# Altium footprint library kalios.PcbLib: 404 footprints (part 9 of 26)
Each footprint in its own frame and in the unit in brackets; x right, y up, seen from the top. Pads: shape width x height; smd on the part's side, far side on the other; paste and mask are expansions set on the pad; w line width, h text height; cw(c..) or ccw(c..) is an arc to the next point about the centre after c.
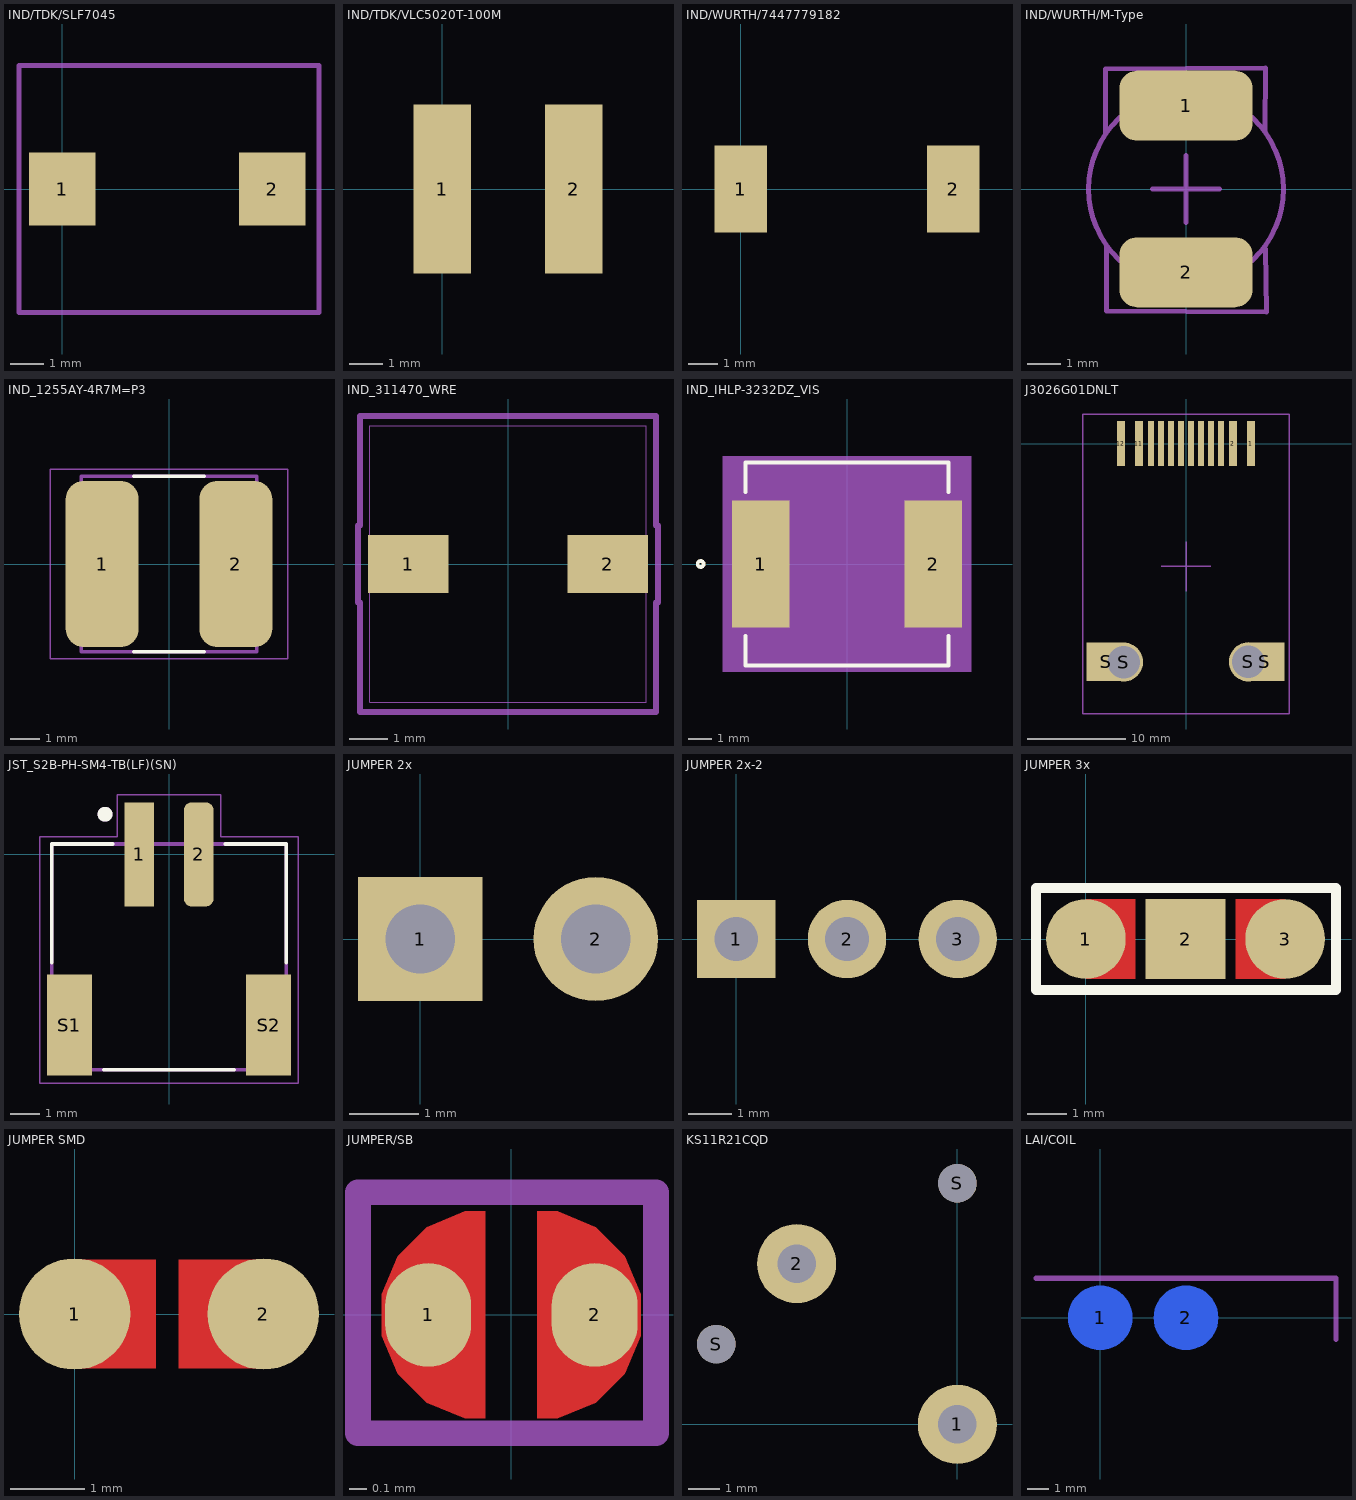
[diagram p8: the footprints below, top view; thin cyan lines are the x and y axes]

## IND/TDK/SLF7045 [mm] "TDK Inductor"
pads (2):
  rect 2x2.2 smd: 1(0,0) 2(6.3,0)
Top Courtyard:
  lines w0.15: -1.3,-3.7 7.7,-3.7 7.7,3.7 -1.3,3.7 -1.3,-3.7
Top Designator:
  text ".Designator" at -4.418,-0.508 h1.52
3D body "SLF7045.STEP": height 4.51, standoff -0.1, extent -0.469,-3.5 6.731,3.5

## IND/TDK/VLC5020T-100M [mm]
pads (2):
  rect 1.7x5 smd: 1(0,0) 2(3.9,0)
Top Designator:
  text ".Designator" at -5.668,-0.508 h1.52
3D body "VLC5020T-100M.STEP": height 2, standoff 0, extent -0.6,-2.6 4.4,2.4

## IND/WURTH/7447779182 [mm]
pads (2):
  rect 1.8x3 smd: 1(0,0) 2(7.3,0)
Top Designator:
  text ".Designator" at -3.968,-0.508 h1.52
3D body "7447779182.STEP": height 4.5, standoff 0, extent 0.05,-3.65 7.35,3.65

## IND/WURTH/M-Type [mm] "732-1276-1-ND"
pads (2):
  rrect50% 4x2.1 smd: 1(0,2.5) 2(0,-2.5)
Top Courtyard:
  circle w0.15: c0,0 r2.921
  lines w0.15: -2.413,1.676 -2.413,3.607 2.388,3.632 2.365,1.753 ; -2.388,-1.727 -2.388,-3.658 2.413,-3.683 2.391,-1.804 ; -1,0 1,0 ; 0,-1 0,1
Top Designator:
  text ".Designator" at -7.618,-0.533 h1.52
3D body "WE-PD2_5848.stp": height 4.5, standoff 0, extent -2.6,-2.889 2.6,2.898

## IND_1255AY-4R7M=P3 [mm]
pads (2):
  rrect50% 2.5x5.7 smd: 1(-2.286,0) 2(2.286,0)
Top Overlay:
  lines w0.127: -1.2,-3 1.2,-3 ; -1.2,3 1.2,3
Top 3D Body:
  lines w0.127: -3,-3 -3,3 3,3 3,-3 -3,-3
Top Courtyard:
  lines w0.05: -4.064,-3.25 -4.064,3.25 4.064,3.25 4.064,-3.25 -4.064,-3.25
3D body "1255AY-4R7M=P3.STEP": height 4.5, standoff 0, extent -3,-3 3,3

## IND_311470_WRE [mil]
pads (2):
  rect 82.5x59 smd paste+0 mask+0: 1(-102.25,0) 2(102.25,0)
Top 3D Body:
  circle w0: c-138.5,0 r3
  lines w1: -141.5,-141.5 -141.5,141.5 141.5,141.5 141.5,-141.5 -141.5,-141.5
Top Courtyard:
  lines w6: -153.5,-39.5 -151.5,-39.5 -151.5,-151.5 151.5,-151.5 151.5,-39.5 153.5,-39.5 153.5,39.5 151.5,39.5 151.5,151.5 -151.5,151.5 -151.5,39.5 -153.5,39.5 -153.5,-39.5
Top Designator:
  text ".Designator" at -149.25,-9.18 h27.56
3D body "744311022_Download_STP_WE-HCI-7040_rev1.STEP": height 157.48, standoff 0.05, extent -140.59,-135.83 135,135.83

## IND_IHLP-3232DZ_VIS [mil]
pads (2):
  rect 95x210 smd paste-47.5 mask+0: 1(-142.5,0) 2(142.5,0)
Top Overlay:
  circle w6: c-241.5,0 r5
  lines w6: -167.5,-118.1 -167.5,-167.5 167.5,-167.5 167.5,-118.1 ; -167.5,118.1 -167.5,167.5 167.5,167.5 167.5,118.1
Assembly Notes:
  region: 205,-177.5 -205,-177.5 -205,177.5 205,177.5
Top 3D Body:
  circle w0: c-95,0 r3
  lines w0: -12,162.5 ccw(c0,162.5) 12,162.5
  lines w1: -162.5,-162.5 162.5,-162.5 162.5,162.5 -162.5,162.5 -162.5,-162.5
Top Courtyard:
  region: -172.5,-115 -200,-115 -200,115 -172.5,115 -172.5,172.5 172.5,172.5 172.5,115 200,115 200,-115 172.5,-115 172.5,-172.5 -172.5,-172.5
  lines w6: -200,-115 -200,115 -172.5,115 -172.5,172.5 172.5,172.5 172.5,115 200,115 200,-115 172.5,-115 172.5,-172.5 -172.5,-172.5 -172.5,-115 -200,-115
Top Designator:
  text ".Designator" at -322.15,-19.99 h60
3D body: height 10, standoff 0, extent 0,0 10,10
3D body "IND_IHLP-3232DZ_VIS.STEP": height 158.11, standoff 0, extent -162.47,-162.47 162.49,162.49

## J3026G01DNLT [mm] "CONN MAGJACK 1PORT 100 BASE-TX"
pads (16):
  rect 0.81x4.6 smd: 1(6.6,0) 2(4.76,0) 11(-4.78,0) 12(-6.62,0)
  rect 0.61x4.6 smd: 3(3.56,0) 4(2.54,0) 5(1.52,0) 6(0.5,0) 7(-0.52,0) 8(-1.54,0) 9(-2.56,0) 10(-3.58,0)
  rect 4x3.9 smd: S(-8.1,-22.2) S(8,-22.2)
  round 4 hole 3.3: S(-6.35,-22.22) S(6.35,-22.2)
Top Courtyard:
  lines w0.15: -2.5,-12.5 2.5,-12.5 ; 0,-15 0,-10 ; -10.5,-27.5 10.5,-27.5 10.5,3 -10.5,3 -10.5,-27.5
Top Designator:
  text ".Designator" at -7.618,-12.758 h1.52
3D body "User Library-RJ45.STEP": height 14.7, standoff -0.5, extent -9.5,-27.51 9.5,-0.51

## JST_S2B-PH-SM4-TB(LF)(SN) [mm]
pads (4):
  rect 1x3.5 smd: 1(-1,0)
  rrect50% 1x3.5 smd: 2(1,0)
  rect 1.5x3.4 smd: S1(-3.35,-5.75) S2(3.35,-5.75)
Top Overlay:
  circle w0.3: c-2.15,1.35 r0.1
  lines w0.127: -3.95,-3.65 -3.95,0.35 -1.9,0.35 ; -2.2,-7.25 2.2,-7.25 ; 1.9,0.35 3.95,0.35 3.95,-3.65
Top 3D Body:
  circle w0.3: c-2.15,1.35 r0.1
  lines w0.127: -3.95,-7.25 -3.95,0.35 3.95,0.35 3.95,-7.25 -3.95,-7.25
Top Courtyard:
  lines w0.05: -4.35,-7.7 -4.35,0.6 -1.75,0.6 -1.75,2 1.75,2 1.75,0.6 4.35,0.6 4.35,-7.7 -4.35,-7.7
3D body "S2B-PH-SM4-TB(LF)(SN)--3DModel-STEP-56544.STEP": height 5.55, standoff -0.05, extent -3.95,-7.366 3.95,1.234

## JUMPER 2x [mm]
pads (2):
  rect 1.8x1.8 hole 1: 1(0,0)
  round 1.8 hole 1: 2(2.54,0)
Top Designator:
  text ".Designator" at -6.373,-0.508 h1.52
3D body "Assemblage1.STEP": height 16.11, standoff -2.47, extent -1.295,-1.27 3.785,1.27

## JUMPER 2x-2 [mm]
pads (3):
  rect 1.8x1.8 hole 1: 1(0,0)
  round 1.8 hole 1: 2(2.54,0) 3(5.08,0)
Top Designator:
  text ".Designator" at -5.078,-0.513 h1.52
3D body "JMP.STEP": height 16.31, standoff -2.5, extent -1.21,-1.255 6.29,1.245

## JUMPER 3x [mil]
pads (3):
  round 80 smd: 1(0,0) 3(200,0)
  rect 80x80 smd: 2(100,0)
Top Layer:
  rectangle: 150,-40 200,40
  rectangle: 0,-40 50,40
Top Overlay:
  lines w10: -50,-51 251,-51 251,51 -50,51 -50,-51
Top Solder:
  rectangle: 0,-43 200,43
Top Designator:
  text ".Designator" at -199.4,-19.99 h60

## JUMPER SMD [mm]
pads (2):
  round 1.5 smd: 1(0,0) 2(2.54,0)
Top Layer:
  rectangle: 0,-0.737 1.092,0.737
  rectangle: 1.397,-0.737 2.515,0.737
Top Solder:
  rectangle: 0,-0.838 2.515,0.838
Top Designator:
  text ".Designator" at -6.348,-0.508 h1.52

## JUMPER/SB [mm]
pads (2):
  oval 0.5x0.6 smd paste-2 mask+0.07: 1(-0.483,0) 2(0.483,0)
Top Layer:
  region: -0.15,0.6 -0.269,0.6 -0.49,0.509 -0.659,0.34 -0.75,0.119 -0.75,-0.119 -0.659,-0.34 -0.49,-0.509 -0.269,-0.6 -0.15,-0.6
  region: 0.15,-0.6 0.269,-0.6 0.49,-0.509 0.659,-0.34 0.75,-0.119 0.75,0.119 0.659,0.34 0.49,0.509 0.269,0.6 0.15,0.6
Top Solder:
  region: -0.147,-0.7 0.156,-0.7 0.15,-0.7 0.242,-0.7 0.42,-0.652 0.58,-0.56 0.71,-0.43 0.802,-0.27 0.85,-0.092 0.85,0.092 0.802,0.27 0.71,0.43 0.58,0.56 0.42,0.652 0.242,0.7 0.15,0.7 0.158,0.699 -0.146,0.699 -0.15,0.7 -0.242,0.7 -0.42,0.652 -0.58,0.56 -0.71,0.43 -0.802,0.27 -0.85,0.092 -0.85,-0.092 -0.802,-0.27 -0.71,-0.43 -0.58,-0.56 -0.42,-0.652 -0.242,-0.7 -0.15,-0.7
Top Courtyard:
  lines w0.15: -0.889,0.711 -0.889,-0.686 0.838,-0.686 0.838,0.711 -0.864,0.711
Top Designator:
  text ".Designator" at -3.499,-0.233 h0.7

## KS11R21CQD [mm]
pads (4):
  round 2.5 hole 1.22: 1(0,0) 2(-5.08,5.08)
  round 1.22 hole 1.22 unplated: S(-7.62,2.54) S(0,7.62)
Top Designator:
  text ".Designator" at -11.478,3.251 h1.52
3D body "KS11R21CQD.STEP": height 9.7, standoff -3.9, extent -10.011,-2.391 2.289,9.909

## LAI/COIL [mm]
pads (2):
  round 3 smd far side: 1(0,0) 2(4,0)
Top Dimensions:
  lines w0.254: -3,1.85 11,1.85 11,-1
Top Designator:
  text ".Designator" at -5.618,8.893 h1.52
3D body "coil.STEP": height 11.11, standoff -4.89, extent -7.129,-3.099 10.871,21.901